# Altium footprint library connectors.PcbLib: 256 footprints (part 11 of 16)
Each footprint in its own frame and in the unit in brackets; x right, y up, seen from the top. Pads: shape width x height; smd on the part's side, far side on the other; paste and mask are expansions set on the pad; w line width, h text height; cw(c..) or ccw(c..) is an arc to the next point about the centre after c.
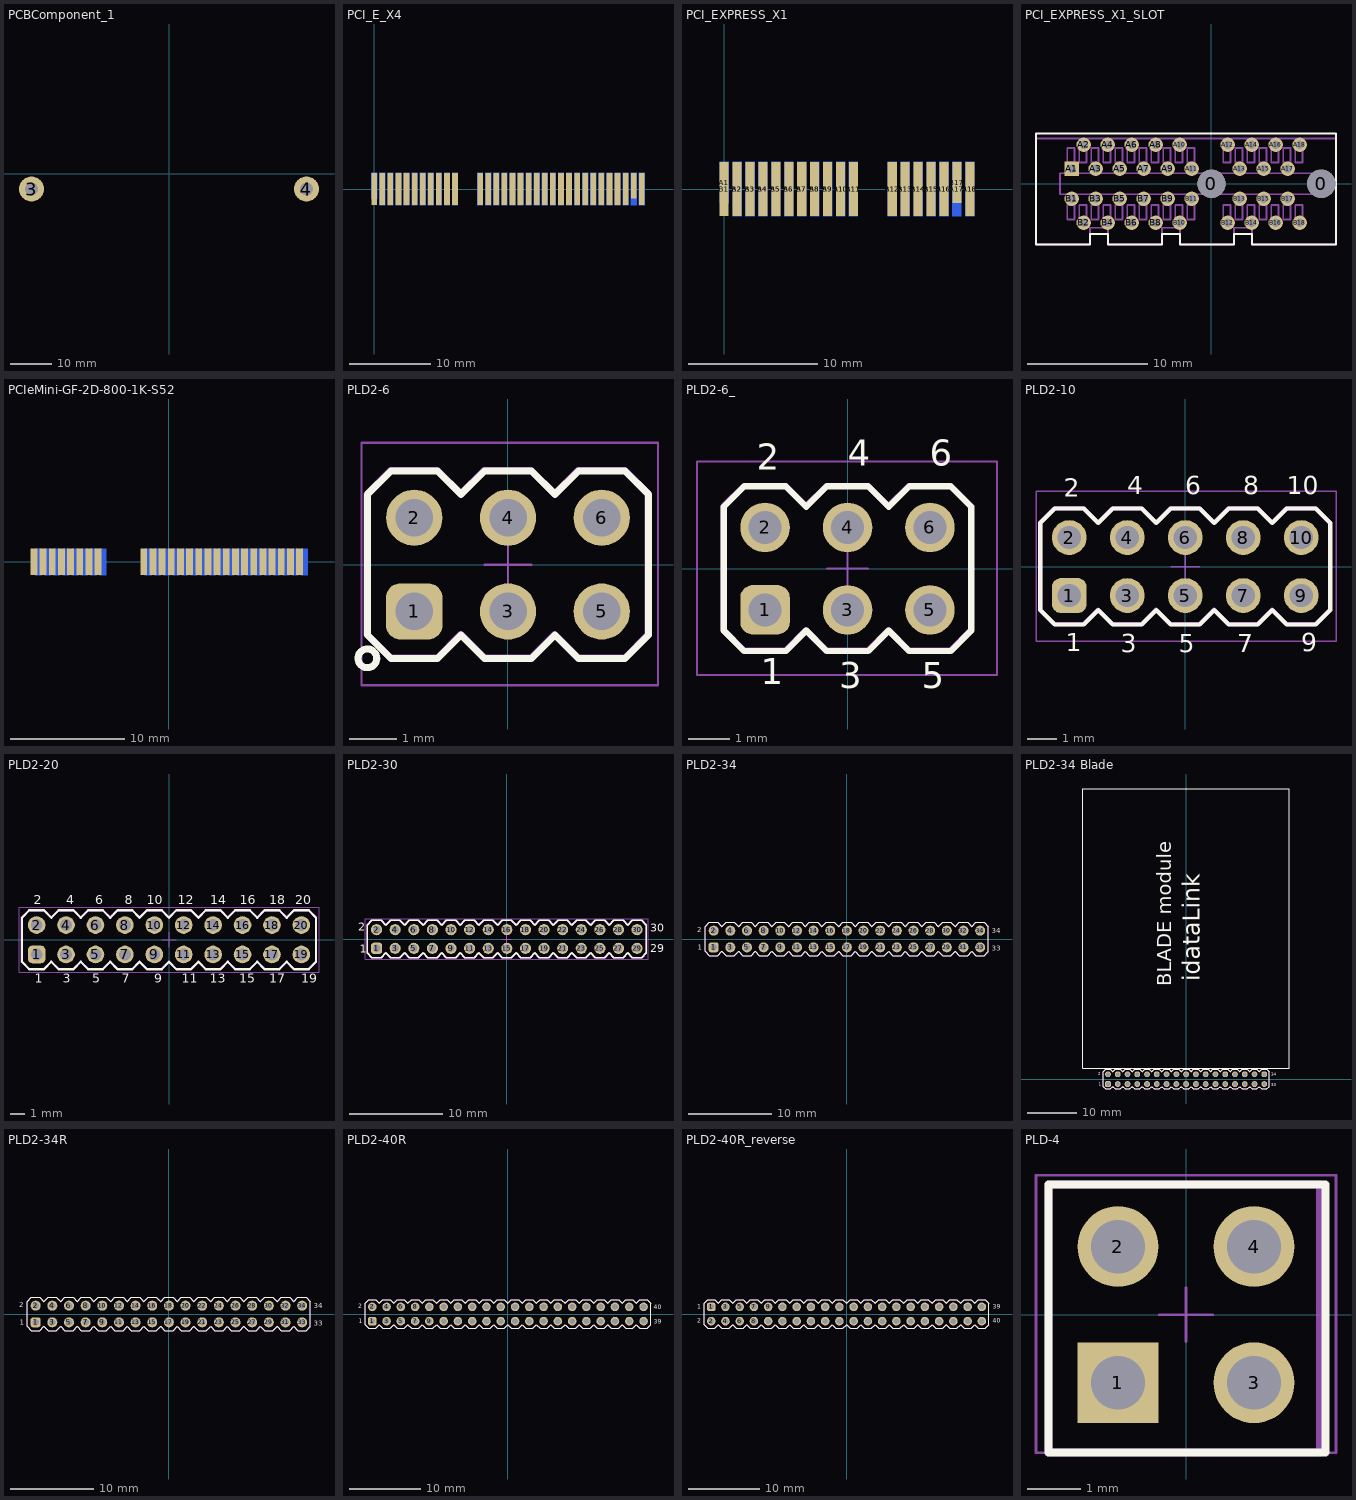
[diagram p10: the footprints below, top view; thin cyan lines are the x and y axes]

## PCBComponent_1 [mm]
pads (2):
  round 6 hole 3.2: 3(-33,-3.6) 4(33,-3.6)
3D body "Konica_Minolta_1024i.stp": height -0.5, standoff -95.2, extent -64.1,-8.6 67.1,8.6

## PCI_E_X4 [mm]
pads (64):
  rect 0.7x3.2 smd far side: A1(0,0.4)
  rect 0.7x4 smd far side: A2(1,0) A3(2,0) A4(3,0) A5(4,0) A6(5,0) A7(6,0) A8(7,0) A9(8,0) A10(9,0) A11(10,0) A12(13.1,0) A13(14.1,0) A14(15.1,0) A15(16.1,0) A16(17.1,0) A17(18.1,0) A18(19.1,0) A19(20.1,0) A20(21.1,0) A21(22.1,0) A22(23.1,0) A23(24.1,0) A24(25.1,0) A25(26.1,0) A26(27.1,0) A27(28.1,0) A28(29.1,0) A29(30.1,0) A30(31.1,0) A31(32.1,0) A32(33.1,0)
  rect 0.7x4 smd: B1(0,0) B2(1,0) B3(2,0) B4(3,0) B5(4,0) B6(5,0) B7(6,0) B8(7,0) B9(8,0) B10(9,0) B11(10,0) B12(13.1,0) B13(14.1,0) B14(15.1,0) B15(16.1,0) B16(17.1,0) B17(18.1,0) B18(19.1,0) B19(20.1,0) B20(21.1,0) B21(22.1,0) B22(23.1,0) B23(24.1,0) B24(25.1,0) B25(26.1,0) B26(27.1,0) B27(28.1,0) B28(29.1,0) B29(30.1,0) B30(31.1,0) B32(33.1,0)
  rect 0.7x3.2 smd: B31(32.1,0.4)

## PCI_EXPRESS_X1 [mm]
pads (36):
  rect 0.7x3.2 smd far side: A1(0,0.5)
  rect 0.7x4.2 smd far side: A2(1,0) A3(2,0) A4(3,0) A5(4,0) A6(5,0) A7(6,0) A8(7,0) A9(8,0) A10(9,0) A11(10,0) A12(13,0) A13(14,0) A14(15,0) A15(16,0) A16(17,0) A17(18,0) A18(19,0)
  rect 0.7x4.2 smd: B1(0,0) B2(1,0) B3(2,0) B4(3,0) B5(4,0) B6(5,0) B7(6,0) B8(7,0) B9(8,0) B10(9,0) B11(10,0) B12(13,0) B13(14,0) B14(15,0) B15(16,0) B16(17,0) B18(19,0)
  rect 0.7x3.2 smd: B17(18,0.5)

## PCI_EXPRESS_X1_SLOT [mm] "PCI Express Connector 36 Circuits 87715-9006 MOLEX"
height 11.2
pads (38):
  round 2.35 hole 2.35 unplated mask+0.075: 0(0,0)
  round 2.35 hole 2.35 unplated: 0(9.15,0)
  rect 1.2x1.2 hole 0.7: A1(-11.65,1.25)
  round 1.2 hole 0.7: A2(-10.65,3.25) A3(-9.65,1.25) A4(-8.65,3.25) A5(-7.65,1.25) A6(-6.65,3.25) A7(-5.65,1.25) A8(-4.65,3.25) A9(-3.65,1.25) A10(-2.65,3.25) A11(-1.65,1.25) A12(1.35,3.25) A13(2.35,1.25) A14(3.35,3.25) A15(4.35,1.25) A16(5.35,3.25) A17(6.35,1.25) A18(7.35,3.25) B1(-11.65,-1.25) B2(-10.65,-3.25) B3(-9.65,-1.25) B4(-8.65,-3.25) B5(-7.65,-1.25) B6(-6.65,-3.25) B7(-5.65,-1.25) B8(-4.65,-3.25) B9(-3.65,-1.25) B10(-2.65,-3.25) B11(-1.65,-1.25) B12(1.35,-3.25) B13(2.35,-1.25) B14(3.35,-3.25) B15(4.35,-1.25) B16(5.35,-3.25) B17(6.35,-1.25) B18(7.35,-3.25)
Top Overlay:
  lines w0.15: -14.625,-5.075 -14.625,4.2 10.375,4.2 10.375,-5.075 3.375,-5.075 3.375,-4.2 1.875,-4.2 1.875,-5.075 -2.625,-5.075 -2.625,-4.2 -4.125,-4.2 -4.125,-5.075 -8.625,-5.075 -8.625,-4.2 -10.125,-4.2 -10.125,-5.075 -14.625,-5.075
TopAssy 13:
  drawing of 167 lines, arcs and shapes, not listed
3D body "877159006.stp": height 11.16, standoff -4.44, extent -14.625,-5.075 10.375,3.775

## PCIeMini-GF-2D-800-1K-S52 [mm] "Golden finger, PCIeMini, Dual, Staggered, Pitch 0.8mm, 52-Position"
pads (52):
  rect 0.6x2.3 smd paste-0.9: 1(-11.8,0) 3(-11,0) 5(-10.2,0) 7(-9.4,0) 9(-8.6,0) 11(-7.8,0) 13(-7,0) 15(-6.2,0) 17(-2.2,0) 19(-1.4,0) 21(-0.6,0) 23(0.2,0) 25(1,0) 27(1.8,0) 29(2.6,0) 31(3.4,0) 33(4.2,0) 35(5,0) 37(5.8,0) 39(6.6,0) 41(7.4,0) 43(8.2,0) 45(9,0) 47(9.8,0) 49(10.6,0) 51(11.4,0)
  rect 0.6x2.3 smd far side paste-0.9: 2(-11.4,0) 4(-10.6,0) 6(-9.8,0) 8(-9,0) 10(-8.2,0) 12(-7.4,0) 14(-6.6,0) 16(-5.8,0) 18(-1.8,0) 20(-1,0) 22(-0.2,0) 24(0.6,0) 26(1.4,0) 28(2.2,0) 30(3,0) 32(3.8,0) 34(4.6,0) 36(5.4,0) 38(6.2,0) 40(7,0) 42(7.8,0) 44(8.6,0) 46(9.4,0) 48(10.2,0) 50(11,0) 52(11.8,0)
Top Solder:
  rectangle: -13.1,-1.65 13.1,1.275
Bottom Solder:
  rectangle: -13.1,-1.65 13.1,1.275

## PLD2-6 [mm]
pads (6):
  rrect50% 1.2x1.2 hole 0.8: 1(-2,-1)
  round 1.2 hole 0.8: 2(-2,1) 3(0,-1) 4(0,1) 5(2,-1) 6(2,1)
Top Overlay:
  circle w0.15: c-3,-2 r0.2
  lines w0.15: -3,1.5 -3,1.5 ; -3,1.5 -2.5,2 -1.5,2 -1,1.5 -0.5,2 0.5,2 1,1.5 ; -3,1.5 -3,-1.5 -2.5,-2 -1.5,-2 -1,-1.5 ; -1,-1.5 -0.5,-2 0.5,-2 1,-1.5 ; -1,-1.5 -1,-1.5 ; 1,-1.5 1.5,-2 2.5,-2 3,-1.5 3,1.5 2.5,2 1.5,2 1,1.5 ; 1,-1.5 1,-1.5 ; 1,1.5 1,1.5
TopAssy 13:
  lines w0.15: -3.008,1.508 -3.008,-1.492 -2.508,-1.992 -1.508,-1.992 -1.008,-1.492 -1.008,-1.492 -0.508,-1.992 0.492,-1.992 0.992,-1.492 ; -3.008,1.508 -2.508,2.008 -1.508,2.008 -1.008,1.508 -0.508,2.008 0.492,2.008 0.992,1.508 ; -3.008,1.508 -3.008,1.508 ; 0.992,-1.492 0.992,-1.492 ; 0.992,-1.492 1.492,-1.992 2.492,-1.992 2.992,-1.492 ; 0.992,1.508 1.492,2.008 2.492,2.008 2.992,1.508 2.992,-1.492 ; 0.992,1.508 0.992,1.508 ; 2.992,-1.492 2.992,-1.492 ; -2.4,-1.4 -2.4,-0.6 -1.625,-0.6 -1.625,-1.4 -2.4,-1.4
TopCourt 15:
  lines w0.05: -0.5,0 0.5,0 ; 0,-0.5 0,0.5 ; -3.125,-2.575 3.2,-2.575 3.2,2.6 -3.125,2.6 -3.125,-2.575
3D body: height 6, standoff -2, extent 1.691,0.701 2.289,1.299
3D body: height 6, standoff -2, extent 1.691,-1.299 2.289,-0.701
3D body: height 6, standoff -2, extent -0.309,0.701 0.289,1.299
3D body: height 6, standoff -2, extent -2.309,0.701 -1.711,1.299
3D body: height 6, standoff -2, extent -0.309,-1.299 0.289,-0.701
3D body: height 6, standoff -2, extent -2.309,-1.299 -1.711,-0.701
3D body: height 2, standoff 0, extent -3.047,-2.054 2.953,1.947

## PLD2-6_ [mm]
height 2.1
pads (6):
  rrect50% 1.2x1.2 hole 0.8: 1(-2,-1)
  round 1.2 hole 0.8: 2(-2,1) 3(0,-1) 4(0,1) 5(2,-1) 6(2,1)
Top Overlay:
  lines w0.15: -3,1.5 -3,1.5 ; -3,1.5 -2.5,2 -1.5,2 -1,1.5 -0.5,2 0.5,2 1,1.5 ; -3,1.5 -3,-1.5 -2.5,-2 -1.5,-2 -1,-1.5 ; -1,-1.5 -0.5,-2 0.5,-2 1,-1.5 ; -1,-1.5 -1,-1.5 ; 1,-1.5 1.5,-2 2.5,-2 3,-1.5 ; 1,-1.5 1,-1.5 ; 1,1.5 1,1.5 ; 1,1.5 1.5,2 2.5,2 3,1.5 3,-1.5 ; 3,-1.5 3,-1.5
  text "6" at 2,2.5 h0.63
  text "4" at 0,2.5 h0.63
  text "2" at -2.2,2.4 h0.63
  text "5" at 1.8,-2.9 h0.63
  text "3" at -0.2,-2.9 h0.63
  text "1" at -2.1,-2.8 h0.63
TopAssy 13:
  lines w0.15: -3.008,1.508 -3.008,-1.492 -2.508,-1.992 -1.508,-1.992 -1.008,-1.492 -1.008,-1.492 -0.508,-1.992 0.492,-1.992 0.992,-1.492 ; -3.008,1.508 -2.508,2.008 -1.508,2.008 -1.008,1.508 -0.508,2.008 0.492,2.008 0.992,1.508 ; -3.008,1.508 -3.008,1.508 ; 0.992,-1.492 0.992,-1.492 ; 0.992,-1.492 1.492,-1.992 2.492,-1.992 2.992,-1.492 ; 0.992,1.508 1.492,2.008 2.492,2.008 2.992,1.508 2.992,-1.492 ; 0.992,1.508 0.992,1.508 ; 2.992,-1.492 2.992,-1.492 ; -2.2,-1.2 -1.8,-1.2 -1.8,-0.8 -2.2,-0.8 -2.2,-1.2 ; -2.2,0.8 -2.2,1.2 -1.8,1.2 -1.8,0.8 -2.2,0.8 ; -0.2,-1.2 -0.2,-0.8 0.2,-0.8 0.2,-1.2 -0.2,-1.2 ; -0.2,0.8 -0.2,1.2 0.2,1.2 0.2,0.8 -0.2,0.8 ; 1.8,-1.2 1.8,-0.8 2.2,-0.8 2.2,-1.2 1.8,-1.2 ; 1.8,0.8 1.8,1.2 2.2,1.2 2.2,0.8 1.8,0.8
TopCourt 15:
  lines w0.05: -0.5,0 0.5,0 ; 0,-0.5 0,0.5 ; -3.65,-2.575 -3.65,2.6 3.625,2.6 3.625,-2.575 -3.65,-2.575
3D body: height 6, standoff -2, extent 1.691,0.701 2.289,1.299
3D body: height 6, standoff -2, extent 1.691,-1.299 2.289,-0.701
3D body: height 6, standoff -2, extent -0.309,0.701 0.289,1.299
3D body: height 6, standoff -2, extent -2.309,0.701 -1.711,1.299
3D body: height 6, standoff -2, extent -0.309,-1.299 0.289,-0.701
3D body: height 6, standoff -2, extent -2.309,-1.299 -1.711,-0.701
3D body: height 2, standoff 0, extent -3.048,-2.054 3,1.947

## PLD2-10 [mm]
height 2.1
pads (10):
  rrect50% 1.2x1.2 hole 0.8: 1(-4,-1)
  round 1.2 hole 0.8: 2(-4,1) 3(-2,-1) 4(-2,1) 5(0,-1) 6(0,1) 7(2,-1) 8(2,1) 9(4,-1) 10(4,1)
Top Overlay:
  lines w0.15: -5,1.5 -5,-1.5 -4.5,-2 -3.5,-2 -3,-1.5 ; -5,1.5 -4.5,2 -3.5,2 -3,1.5 -2.5,2 -1.5,2 -1,1.5 ; -5,1.5 -5,1.5 ; -3,-1.5 -3,-1.5 ; -3,-1.5 -2.5,-2 -1.5,-2 -1,-1.5 ; -1,-1.5 -1,-1.5 ; -1,-1.5 -0.5,-2 0.5,-2 1,-1.5 ; -1,1.5 -0.5,2 0.5,2 1,1.5 1.5,2 2.5,2 3,1.5 3.5,2 4.5,2 5,1.5 5,-1.5 4.5,-2 3.5,-2 3,-1.5 2.5,-2 1.5,-2 1,-1.5 ; -1,1.5 -1,1.5 ; 1,-1.5 1,-1.5
  text "10" at 3.5,2.5 h0.63
  text "9" at 4,-2.925 h0.63
  text "8" at 2,2.5 h0.63
  text "7" at 1.8,-2.95 h0.63
  text "1" at -4.125,-2.925 h0.63
  text "3" at -2.225,-2.95 h0.63
  text "5" at -0.225,-2.95 h0.63
  text "2" at -4.2,2.4 h0.63
  text "4" at -2,2.5 h0.63
  text "6" at 0,2.5 h0.63
TopAssy 13:
  lines w0.15: -5.008,1.508 -5.008,1.508 ; -5.008,1.508 -4.508,2.008 -3.508,2.008 -3.008,1.508 -2.508,2.008 -1.508,2.008 -1.008,1.508 -1.008,1.508 -0.508,2.008 0.492,2.008 0.992,1.508 1.492,2.008 2.492,2.008 2.992,1.508 3.492,2.008 4.492,2.008 4.992,1.508 4.992,-1.492 4.492,-1.992 3.492,-1.992 2.992,-1.492 2.492,-1.992 1.492,-1.992 0.992,-1.492 ; -5.008,1.508 -5.008,-1.492 -4.508,-1.992 -3.508,-1.992 -3.008,-1.492 ; -3.008,-1.492 -2.508,-1.992 -1.508,-1.992 -1.008,-1.492 ; -3.008,-1.492 -3.008,-1.492 ; -1.008,-1.492 -0.508,-1.992 0.492,-1.992 0.992,-1.492 ; -1.008,-1.492 -1.008,-1.492 ; 0.992,-1.492 0.992,-1.492 ; -4.3,-1.425 -4.3,-0.625 -3.525,-0.625 -3.525,-1.425 -4.3,-1.425
TopCourt 15:
  lines w0.05: -0.5,0 0.5,0 ; 0,-0.5 0,0.5 ; -5.15,-2.575 -5.15,2.6 5.2,2.6 5.2,-2.575 -5.15,-2.575
3D body: height 2, standoff 0, extent -5.048,-2.054 4.954,1.947
3D body: height 6, standoff -2, extent -4.309,-1.299 -3.711,-0.701
3D body: height 6, standoff -2, extent -2.309,-1.299 -1.711,-0.701
3D body: height 6, standoff -2, extent -4.309,0.701 -3.711,1.299
3D body: height 6, standoff -2, extent -2.309,0.701 -1.711,1.299
3D body: height 6, standoff -2, extent -0.309,-1.299 0.289,-0.701
3D body: height 6, standoff -2, extent 1.691,-1.299 2.289,-0.701
3D body: height 6, standoff -2, extent 3.691,-1.299 4.289,-0.701
3D body: height 6, standoff -2, extent -0.309,0.701 0.289,1.299
3D body: height 6, standoff -2, extent 1.691,0.701 2.289,1.299
3D body: height 6, standoff -2, extent 3.691,0.701 4.289,1.299

## PLD2-20 [mm]
height 2.1
pads (20):
  rrect50% 1.2x1.2 hole 0.8: 1(-9,-1)
  round 1.2 hole 0.8: 2(-9,1) 3(-7,-1) 4(-7,1) 5(-5,-1) 6(-5,1) 7(-3,-1) 8(-3,1) 9(-1,-1) 10(-1,1) 11(1,-1) 12(1,1) 13(3,-1) 14(3,1) 15(5,-1) 16(5,1) 17(7,-1) 18(7,1) 19(9,-1) 20(9,1)
Top Overlay:
  lines w0.15: -10,1.5 -10,1.5 ; -10,1.5 -9.5,2 -8.5,2 -8,1.5 -7.5,2 -6.5,2 -6,1.5 ; -10,1.5 -10,-1.5 -9.5,-2 -8.5,-2 -8,-1.5 ; -8,-1.5 -7.5,-2 -6.5,-2 -6,-1.5 ; -8,-1.5 -8,-1.5 ; -6,-1.5 -5.5,-2 -4.5,-2 -4,-1.5 ; -6,-1.5 -6,-1.5 ; -6,1.5 -6,1.5 ; -6,1.5 -5.5,2 -4.5,2 -4,1.5 -3.5,2 -2.5,2 -2,1.5 -1.5,2 -0.5,2 0,1.5 ; -4,-1.5 -3.5,-2 -2.5,-2 -2,-1.5 -1.5,-2 -0.5,-2 0,-1.5 0.5,-2 1.5,-2 2,-1.5 ; -4,-1.5 -4,-1.5 ; 0,1.5 0.5,2 1.5,2 2,1.5 2.5,2 3.5,2 4,1.5 ; 0,1.5 0,1.5 ; 2,-1.5 2,-1.5 ; 2,-1.5 2.5,-2 3.5,-2 4,-1.5 ; 4,-1.5 4,-1.5 ; 4,-1.5 4.5,-2 5.5,-2 6,-1.5 ; 4,1.5 4.5,2 5.5,2 6,1.5 6.5,2 7.5,2 8,1.5 8.5,2 9.5,2 10,1.5 10,-1.5 9.5,-2 8.5,-2 8,-1.5 7.5,-2 6.5,-2 6,-1.5 ; 4,1.5 4,1.5 ; 6,-1.5 6,-1.5
  text "6" at -5,2.4 h0.63
  text "4" at -7,2.4 h0.63
  text "2" at -9.2,2.4 h0.63
  text "5" at -5.225,-2.925 h0.63
  text "3" at -7.225,-2.925 h0.63
  text "1" at -9.125,-2.925 h0.63
  text "7" at -3.2,-2.925 h0.63
  text "8" at -3,2.4 h0.63
  text "9" at -1,-2.925 h0.63
  text "10" at -1.5,2.4 h0.63
  text "20" at 8.6,2.4 h0.63
  text "18" at 6.8,2.4 h0.63
  text "12" at 0.6,2.4 h0.63
  text "14" at 2.8,2.4 h0.63
  text "16" at 4.8,2.4 h0.63
  text "19" at 9,-2.925 h0.63
  text "17" at 6.8,-2.925 h0.63
  text "11" at 0.875,-2.925 h0.63
  text "13" at 2.775,-2.925 h0.63
  text "15" at 4.775,-2.925 h0.63
TopAssy 13:
  lines w0.15: -10.008,1.508 -10.008,-1.492 -9.508,-1.992 -8.508,-1.992 -8.008,-1.492 ; -10.008,1.508 -9.508,2.008 -8.508,2.008 -8.008,1.508 -7.508,2.008 -6.508,2.008 -6.008,1.508 ; -10.008,1.508 -10.008,1.508 ; -8.008,-1.492 -8.008,-1.492 ; -8.008,-1.492 -7.508,-1.992 -6.508,-1.992 -6.008,-1.492 ; -6.008,-1.492 -6.008,-1.492 ; -6.008,-1.492 -5.508,-1.992 -4.508,-1.992 -4.008,-1.492 ; -6.008,1.508 -5.508,2.008 -4.508,2.008 -4.008,1.508 -3.508,2.008 -2.508,2.008 -2.008,1.508 -1.508,2.008 -0.508,2.008 -0.008,1.508 ; -6.008,1.508 -6.008,1.508 ; -4.008,-1.492 -4.008,-1.492 ; -4.008,-1.492 -3.508,-1.992 -2.508,-1.992 -2.008,-1.492 -1.508,-1.992 -0.508,-1.992 -0.008,-1.492 0.492,-1.992 1.492,-1.992 1.992,-1.492 ; -0.008,1.508 -0.008,1.508 ; -0.008,1.508 0.492,2.008 1.492,2.008 1.992,1.508 2.492,2.008 3.492,2.008 3.992,1.508 ; 1.992,-1.492 2.492,-1.992 3.492,-1.992 3.992,-1.492 ; 1.992,-1.492 1.992,-1.492 ; 3.992,-1.492 4.492,-1.992 5.492,-1.992 5.992,-1.492 ; 3.992,-1.492 3.992,-1.492 ; 3.992,1.508 3.992,1.508 ; 3.992,1.508 4.492,2.008 5.492,2.008 5.992,1.508 6.492,2.008 7.492,2.008 7.992,1.508 8.492,2.008 9.492,2.008 9.992,1.508 9.992,-1.492 9.492,-1.992 8.492,-1.992 7.992,-1.492 7.492,-1.992 6.492,-1.992 5.992,-1.492 ; 5.992,-1.492 5.992,-1.492 ; -9.3,-1.425 -8.525,-1.425 -8.525,-0.625 -9.3,-0.625 -9.3,-1.425
TopCourt 15:
  lines w0.05: -0.5,0 0.5,0 ; 0,-0.5 0,0.5 ; -10.2,-2.2 10.2,-2.2 10.2,2.2 -10.2,2.2 -10.2,-2.2
3D body: height 6, standoff -2, extent -1.309,0.701 -0.711,1.299
3D body: height 6, standoff -2, extent -3.309,0.701 -2.711,1.299
3D body: height 6, standoff -2, extent -5.309,0.701 -4.711,1.299
3D body: height 6, standoff -2, extent -1.309,-1.299 -0.711,-0.701
3D body: height 6, standoff -2, extent -3.309,-1.299 -2.711,-0.701
3D body: height 6, standoff -2, extent -5.309,-1.299 -4.711,-0.701
3D body: height 6, standoff -2, extent -7.309,0.701 -6.711,1.299
3D body: height 6, standoff -2, extent -9.309,0.701 -8.711,1.299
3D body: height 6, standoff -2, extent -7.309,-1.299 -6.711,-0.701
3D body: height 6, standoff -2, extent -9.309,-1.299 -8.711,-0.701
3D body: height 2, standoff 0, extent -10.048,-2.054 -0.046,1.947
3D body: height 2, standoff 0, extent -0.048,-2.054 9.954,1.947
3D body: height 6, standoff -2, extent 0.691,-1.299 1.289,-0.701
3D body: height 6, standoff -2, extent 2.691,-1.299 3.289,-0.701
3D body: height 6, standoff -2, extent 0.691,0.701 1.289,1.299
3D body: height 6, standoff -2, extent 2.691,0.701 3.289,1.299
3D body: height 6, standoff -2, extent 4.691,-1.299 5.289,-0.701
3D body: height 6, standoff -2, extent 6.691,-1.299 7.289,-0.701
3D body: height 6, standoff -2, extent 8.691,-1.299 9.289,-0.701
3D body: height 6, standoff -2, extent 4.691,0.701 5.289,1.299
3D body: height 6, standoff -2, extent 6.691,0.701 7.289,1.299
3D body: height 6, standoff -2, extent 8.691,0.701 9.289,1.299

## PLD2-30 [mm]
height 2.1
pads (30):
  rrect50% 1.2x1.2 hole 0.8: 1(-14,-1)
  round 1.2 hole 0.8: 2(-14,1) 3(-12,-1) 4(-12,1) 5(-10,-1) 6(-10,1) 7(-8,-1) 8(-8,1) 9(-6,-1) 10(-6,1) 11(-4,-1) 12(-4,1) 13(-2,-1) 14(-2,1) 15(0,-1) 16(0,1) 17(2,-1) 18(2,1) 19(4,-1) 20(4,1) 21(6,-1) 22(6,1) 23(8,-1) 24(8,1) 25(10,-1) 26(10,1) 27(12,-1) 28(12,1) 29(14,-1) 30(14,1)
Top Overlay:
  lines w0.15: -15,1.5 -15,1.5 ; -15,1.5 -14.5,2 -13.5,2 -13,1.5 -12.5,2 -11.5,2 -11,1.5 ; -15,1.5 -15,-1.5 -14.5,-2 -13.5,-2 -13,-1.5 ; -13,-1.5 -12.5,-2 -11.5,-2 -11,-1.5 ; -13,-1.5 -13,-1.5 ; -11,-1.5 -10.5,-2 -9.5,-2 -9,-1.5 ; -11,-1.5 -11,-1.5 ; -11,1.5 -11,1.5 ; -11,1.5 -10.5,2 -9.5,2 -9,1.5 -8.5,2 -7.5,2 -7,1.5 -6.5,2 -5.5,2 -5,1.5 ; -9,-1.5 -8.5,-2 -7.5,-2 -7,-1.5 -6.5,-2 -5.5,-2 -5,-1.5 -4.5,-2 -3.5,-2 -3,-1.5 ; -9,-1.5 -9,-1.5 ; -5,1.5 -4.5,2 -3.5,2 -3,1.5 -2.5,2 -1.5,2 -1,1.5 ; -5,1.5 -5,1.5 ; -3,-1.5 -3,-1.5 ; -3,-1.5 -2.5,-2 -1.5,-2 -1,-1.5 ; -1,-1.5 -1,-1.5 ; -1,-1.5 -0.5,-2 0.5,-2 1,-1.5 ; -1,1.5 -0.5,2 0.5,2 1,1.5 1.5,2 2.5,2 3,1.5 3.5,2 4.5,2 5,1.5 ; -1,1.5 -1,1.5 ; 1,-1.5 1,-1.5 ; 1,-1.5 1.5,-2 2.5,-2 3,-1.5 3.5,-2 4.5,-2 5,-1.5 5.5,-2 6.5,-2 7,-1.5 ; 5,1.5 5,1.5 ; 5,1.5 5.5,2 6.5,2 7,1.5 7.5,2 8.5,2 9,1.5 ; 7,-1.5 7.5,-2 8.5,-2 9,-1.5 ; 7,-1.5 7,-1.5 ; 9,-1.5 9.5,-2 10.5,-2 11,-1.5 ; 9,-1.5 9,-1.5 ; 9,1.5 9,1.5 ; 9,1.5 9.5,2 10.5,2 11,1.5 11.5,2 12.5,2 13,1.5 13.5,2 14.5,2 15,1.5 15,-1.5 14.5,-2 13.5,-2 13,-1.5 12.5,-2 11.5,-2 11,-1.5 ; 11,-1.5 11,-1.5
  text "2" at -16,0.9 h0.85
  text "1" at -15.8,-1.5 h0.85
  text "29" at 15.4,-1.4 h0.85
  text "30" at 15.4,0.8 h0.85
TopAssy 13:
  lines w0.15: -15.008,1.508 -15.008,-1.492 -14.508,-1.992 -13.508,-1.992 -13.008,-1.492 ; -15.008,1.508 -14.508,2.008 -13.508,2.008 -13.008,1.508 -12.508,2.008 -11.508,2.008 -11.008,1.508 ; -15.008,1.508 -15.008,1.508 ; -13.008,-1.492 -13.008,-1.492 ; -13.008,-1.492 -12.508,-1.992 -11.508,-1.992 -11.008,-1.492 ; -11.008,-1.492 -11.008,-1.492 ; -11.008,-1.492 -10.508,-1.992 -9.508,-1.992 -9.008,-1.492 ; -11.008,1.508 -10.508,2.008 -9.508,2.008 -9.008,1.508 -8.508,2.008 -7.508,2.008 -7.008,1.508 -6.508,2.008 -5.508,2.008 -5.008,1.508 ; -11.008,1.508 -11.008,1.508 ; -9.008,-1.492 -9.008,-1.492 ; -9.008,-1.492 -8.508,-1.992 -7.508,-1.992 -7.008,-1.492 -6.508,-1.992 -5.508,-1.992 -5.008,-1.492 -4.508,-1.992 -3.508,-1.992 -3.008,-1.492 ; -5.008,1.508 -5.008,1.508 ; -5.008,1.508 -4.508,2.008 -3.508,2.008 -3.008,1.508 -2.508,2.008 -1.508,2.008 -1.008,1.508 ; -3.008,-1.492 -2.508,-1.992 -1.508,-1.992 -1.008,-1.492 ; -3.008,-1.492 -3.008,-1.492 ; -1.008,-1.492 -0.508,-1.992 0.492,-1.992 0.992,-1.492 ; -1.008,-1.492 -1.008,-1.492 ; -1.008,1.508 -1.008,1.508 ; -1.008,1.508 -0.508,2.008 0.492,2.008 0.992,1.508 1.492,2.008 2.492,2.008 2.992,1.508 3.492,2.008 4.492,2.008 4.992,1.508 ; 0.992,-1.492 1.492,-1.992 2.492,-1.992 2.992,-1.492 3.492,-1.992 4.492,-1.992 4.992,-1.492 5.492,-1.992 6.492,-1.992 6.992,-1.492 ; 0.992,-1.492 0.992,-1.492 ; 4.992,1.508 5.492,2.008 6.492,2.008 6.992,1.508 7.492,2.008 8.492,2.008 8.992,1.508 ; 4.992,1.508 4.992,1.508 ; 6.992,-1.492 6.992,-1.492 ; 6.992,-1.492 7.492,-1.992 8.492,-1.992 8.992,-1.492 ; 8.992,-1.492 8.992,-1.492 ; 8.992,-1.492 9.492,-1.992 10.492,-1.992 10.992,-1.492 ; 8.992,1.508 9.492,2.008 10.492,2.008 10.992,1.508 11.492,2.008 12.492,2.008 12.992,1.508 13.492,2.008 14.492,2.008 14.992,1.508 14.992,-1.492 14.492,-1.992 13.492,-1.992 12.992,-1.492 12.492,-1.992 11.492,-1.992 10.992,-1.492 ; 8.992,1.508 8.992,1.508 ; 10.992,-1.492 10.992,-1.492 ; -14.3,-1.425 -13.525,-1.425 -13.525,-0.625 -14.3,-0.625 -14.3,-1.425
TopCourt 15:
  lines w0.05: -0.5,0 0.5,0 ; 0,-0.5 0,0.5 ; -15.2,-2.2 15.2,-2.2 15.2,2.2 -15.2,2.2 -15.2,-2.2
3D body: height 6, standoff -2, extent -6.309,0.701 -5.711,1.299
3D body: height 6, standoff -2, extent -8.309,0.701 -7.711,1.299
3D body: height 6, standoff -2, extent -10.309,0.701 -9.711,1.299
3D body: height 6, standoff -2, extent -6.309,-1.299 -5.711,-0.701
3D body: height 6, standoff -2, extent -8.309,-1.299 -7.711,-0.701
3D body: height 6, standoff -2, extent -10.309,-1.299 -9.711,-0.701
3D body: height 6, standoff -2, extent -12.309,0.701 -11.711,1.299
3D body: height 6, standoff -2, extent -14.309,0.701 -13.711,1.299
3D body: height 6, standoff -2, extent -12.309,-1.299 -11.711,-0.701
3D body: height 6, standoff -2, extent -14.309,-1.299 -13.711,-0.701
3D body: height 2, standoff 0, extent -15.048,-2.054 -5.046,1.947
3D body: height 2, standoff 0, extent -5.048,-2.054 4.954,1.947
3D body: height 6, standoff -2, extent -4.309,-1.299 -3.711,-0.701
3D body: height 6, standoff -2, extent -2.309,-1.299 -1.711,-0.701
3D body: height 6, standoff -2, extent -4.309,0.701 -3.711,1.299
3D body: height 6, standoff -2, extent -2.309,0.701 -1.711,1.299
3D body: height 6, standoff -2, extent -0.309,-1.299 0.289,-0.701
3D body: height 6, standoff -2, extent 1.691,-1.299 2.289,-0.701
3D body: height 6, standoff -2, extent 3.691,-1.299 4.289,-0.701
3D body: height 6, standoff -2, extent -0.309,0.701 0.289,1.299
3D body: height 6, standoff -2, extent 1.691,0.701 2.289,1.299
3D body: height 6, standoff -2, extent 3.691,0.701 4.289,1.299
3D body: height 6, standoff -2, extent 13.691,0.701 14.289,1.299
3D body: height 6, standoff -2, extent 11.691,0.701 12.289,1.299
3D body: height 6, standoff -2, extent 9.691,0.701 10.289,1.299
3D body: height 6, standoff -2, extent 13.691,-1.299 14.289,-0.701
3D body: height 6, standoff -2, extent 11.691,-1.299 12.289,-0.701
3D body: height 6, standoff -2, extent 9.691,-1.299 10.289,-0.701
3D body: height 6, standoff -2, extent 7.691,0.701 8.289,1.299
3D body: height 6, standoff -2, extent 5.691,0.701 6.289,1.299
3D body: height 6, standoff -2, extent 7.691,-1.299 8.289,-0.701
3D body: height 6, standoff -2, extent 5.691,-1.299 6.289,-0.701
3D body: height 2, standoff 0, extent 4.952,-2.054 14.954,1.947

## PLD2-34 [mm]
height 2.1
pads (34):
  rrect50% 1.2x1.2 hole 0.8: 1(-16,-1)
  round 1.2 hole 0.8: 2(-16,1) 3(-14,-1) 4(-14,1) 5(-12,-1) 6(-12,1) 7(-10,-1) 8(-10,1) 9(-8,-1) 10(-8,1) 11(-6,-1) 12(-6,1) 13(-4,-1) 14(-4,1) 15(-2,-1) 16(-2,1) 17(0,-1) 18(0,1) 19(2,-1) 20(2,1) 21(4,-1) 22(4,1) 23(6,-1) 24(6,1) 25(8,-1) 26(8,1) 27(10,-1) 28(10,1) 29(12,-1) 30(12,1) 31(14,-1) 32(14,1) 33(16,-1) 34(16,1)
Top Overlay:
  lines w0.15: -17,1.5 -17,-1.5 -16.5,-2 -15.5,-2 -15,-1.5 ; -17,1.5 -16.5,2 -15.5,2 -15,1.5 -14.5,2 -13.5,2 -13,1.5 ; -17,1.5 -17,1.5 ; -15,-1.5 -15,-1.5 ; -15,-1.5 -14.5,-2 -13.5,-2 -13,-1.5 ; -13,-1.5 -13,-1.5 ; -13,-1.5 -12.5,-2 -11.5,-2 -11,-1.5 ; -13,1.5 -12.5,2 -11.5,2 -11,1.5 -10.5,2 -9.5,2 -9,1.5 -8.5,2 -7.5,2 -7,1.5 ; -13,1.5 -13,1.5 ; -11,-1.5 -11,-1.5 ; -11,-1.5 -10.5,-2 -9.5,-2 -9,-1.5 -8.5,-2 -7.5,-2 -7,-1.5 -6.5,-2 -5.5,-2 -5,-1.5 -4.5,-2 -3.5,-2 -3,-1.5 -2.5,-2 -1.5,-2 -1,-1.5 ; -7,1.5 -7,1.5 ; -7,1.5 -6.5,2 -5.5,2 -5,1.5 -4.5,2 -3.5,2 -3,1.5 ; -3,1.5 -3,1.5 ; -3,1.5 -2.5,2 -1.5,2 -1,1.5 -0.5,2 0.5,2 1,1.5 1.5,2 2.5,2 3,1.5 ; -1,-1.5 -0.5,-2 0.5,-2 1,-1.5 1.5,-2 2.5,-2 3,-1.5 ; -1,-1.5 -1,-1.5 ; 3,-1.5 3,-1.5 ; 3,-1.5 3.5,-2 4.5,-2 5,-1.5 5.5,-2 6.5,-2 7,-1.5 7.5,-2 8.5,-2 9,-1.5 ; 3,1.5 3,1.5 ; 3,1.5 3.5,2 4.5,2 5,1.5 5.5,2 6.5,2 7,1.5 ; 7,1.5 7,1.5 ; 7,1.5 7.5,2 8.5,2 9,1.5 9.5,2 10.5,2 11,1.5 11.5,2 12.5,2 13,1.5 13.5,2 14.5,2 15,1.5 15.5,2 16.5,2 17,1.5 17,-1.5 ; 9,-1.5 9.5,-2 10.5,-2 11,-1.5 11.5,-2 12.5,-2 13,-1.5 ; 9,-1.5 9,-1.5 ; 13,-1.5 13,-1.5 ; 13,-1.5 13,-1.5 ; 13,-1.5 13.5,-2 14.5,-2 15,-1.5 15.5,-2 16.5,-2 17,-1.5 ; 17,-1.5 17,-1.5
  text "1" at -17.9,-1.3 h0.63
  text "2" at -18,0.8 h0.63
  text "34" at 17.4,0.7 h0.63
  text "33" at 17.4,-1.4 h0.63
TopAssy 13:
  drawing of 390 lines, arcs and shapes, not listed
3D body "User Library-PLD2-34R.step": height 4.1, standoff -2.7, extent -17,-1.3 17,7.95

## PLD2-34 Blade [mm] "Blade iDatalink module"
height 2.1
pads (34):
  rrect50% 1.2x1.2 hole 0.8: 1(-16,-1)
  round 1.2 hole 0.8: 2(-16,1) 3(-14,-1) 4(-14,1) 5(-12,-1) 6(-12,1) 7(-10,-1) 8(-10,1) 9(-8,-1) 10(-8,1) 11(-6,-1) 12(-6,1) 13(-4,-1) 14(-4,1) 15(-2,-1) 16(-2,1) 17(0,-1) 18(0,1) 19(2,-1) 20(2,1) 21(4,-1) 22(4,1) 23(6,-1) 24(6,1) 25(8,-1) 26(8,1) 27(10,-1) 28(10,1) 29(12,-1) 30(12,1) 31(14,-1) 32(14,1) 33(16,-1) 34(16,1)
Top Overlay:
  lines w0.15: -17,1.5 -17,-1.5 -16.5,-2 -15.5,-2 -15,-1.5 ; -17,1.5 -16.5,2 -15.5,2 -15,1.5 -14.5,2 -13.5,2 -13,1.5 ; -17,1.5 -17,1.5 ; -15,-1.5 -15,-1.5 ; -15,-1.5 -14.5,-2 -13.5,-2 -13,-1.5 ; -13,-1.5 -13,-1.5 ; -13,-1.5 -12.5,-2 -11.5,-2 -11,-1.5 ; -13,1.5 -12.5,2 -11.5,2 -11,1.5 -10.5,2 -9.5,2 -9,1.5 -8.5,2 -7.5,2 -7,1.5 ; -13,1.5 -13,1.5 ; -11,-1.5 -11,-1.5 ; -11,-1.5 -10.5,-2 -9.5,-2 -9,-1.5 -8.5,-2 -7.5,-2 -7,-1.5 -6.5,-2 -5.5,-2 -5,-1.5 -4.5,-2 -3.5,-2 -3,-1.5 -2.5,-2 -1.5,-2 -1,-1.5 ; -7,1.5 -7,1.5 ; -7,1.5 -6.5,2 -5.5,2 -5,1.5 -4.5,2 -3.5,2 -3,1.5 ; -3,1.5 -3,1.5 ; -3,1.5 -2.5,2 -1.5,2 -1,1.5 -0.5,2 0.5,2 1,1.5 1.5,2 2.5,2 3,1.5 ; -1,-1.5 -0.5,-2 0.5,-2 1,-1.5 1.5,-2 2.5,-2 3,-1.5 ; -1,-1.5 -1,-1.5 ; 3,-1.5 3,-1.5 ; 3,-1.5 3.5,-2 4.5,-2 5,-1.5 5.5,-2 6.5,-2 7,-1.5 7.5,-2 8.5,-2 9,-1.5 ; 3,1.5 3,1.5 ; 3,1.5 3.5,2 4.5,2 5,1.5 5.5,2 6.5,2 7,1.5 ; 7,1.5 7,1.5 ; 7,1.5 7.5,2 8.5,2 9,1.5 9.5,2 10.5,2 11,1.5 11.5,2 12.5,2 13,1.5 13.5,2 14.5,2 15,1.5 15.5,2 16.5,2 17,1.5 17,-1.5 ; 9,-1.5 9.5,-2 10.5,-2 11,-1.5 11.5,-2 12.5,-2 13,-1.5 ; 9,-1.5 9,-1.5 ; 13,-1.5 13,-1.5 ; 13,-1.5 13,-1.5 ; 13,-1.5 13.5,-2 14.5,-2 15,-1.5 15.5,-2 16.5,-2 17,-1.5 ; 17,-1.5 17,-1.5 ; -21.2,2.2 21.15,2.2 21.15,59.4 -21.2,59.4 -21.2,2.2
  text "idataLink" at 4,20 h6
  text "BLADE module" at -2,19 h5
  text "1" at -17.9,-1.3 h0.63
  text "2" at -18,0.8 h0.63
  text "34" at 17.4,0.7 h0.63
  text "33" at 17.4,-1.4 h0.63
TopAssy 13:
  drawing of 390 lines, arcs and shapes, not listed
3D body "Blade A.STEP": height -0.4, standoff -7.7, extent -21.025,4.225 20.975,59.225
3D body "User Library-PLD2-34R.step": height 4.1, standoff -2.7, extent -17,-1.3 17,7.95

## PLD2-34R [mm]
height 2.1
pads (34):
  rrect50% 1.2x1.2 hole 0.8: 1(-16,-1)
  round 1.2 hole 0.8: 2(-16,1) 3(-14,-1) 4(-14,1) 5(-12,-1) 6(-12,1) 7(-10,-1) 8(-10,1) 9(-8,-1) 10(-8,1) 11(-6,-1) 12(-6,1) 13(-4,-1) 14(-4,1) 15(-2,-1) 16(-2,1) 17(0,-1) 18(0,1) 19(2,-1) 20(2,1) 21(4,-1) 22(4,1) 23(6,-1) 24(6,1) 25(8,-1) 26(8,1) 27(10,-1) 28(10,1) 29(12,-1) 30(12,1) 31(14,-1) 32(14,1) 33(16,-1) 34(16,1)
Top Overlay:
  lines w0.15: -17,1.5 -17,-1.5 -16.5,-2 -15.5,-2 -15,-1.5 ; -17,1.5 -16.5,2 -15.5,2 -15,1.5 -14.5,2 -13.5,2 -13,1.5 ; -17,1.5 -17,1.5 ; -15,-1.5 -15,-1.5 ; -15,-1.5 -14.5,-2 -13.5,-2 -13,-1.5 ; -13,-1.5 -13,-1.5 ; -13,-1.5 -12.5,-2 -11.5,-2 -11,-1.5 ; -13,1.5 -12.5,2 -11.5,2 -11,1.5 -10.5,2 -9.5,2 -9,1.5 -8.5,2 -7.5,2 -7,1.5 ; -13,1.5 -13,1.5 ; -11,-1.5 -11,-1.5 ; -11,-1.5 -10.5,-2 -9.5,-2 -9,-1.5 -8.5,-2 -7.5,-2 -7,-1.5 -6.5,-2 -5.5,-2 -5,-1.5 -4.5,-2 -3.5,-2 -3,-1.5 -2.5,-2 -1.5,-2 -1,-1.5 ; -7,1.5 -7,1.5 ; -7,1.5 -6.5,2 -5.5,2 -5,1.5 -4.5,2 -3.5,2 -3,1.5 ; -3,1.5 -3,1.5 ; -3,1.5 -2.5,2 -1.5,2 -1,1.5 -0.5,2 0.5,2 1,1.5 1.5,2 2.5,2 3,1.5 ; -1,-1.5 -0.5,-2 0.5,-2 1,-1.5 1.5,-2 2.5,-2 3,-1.5 ; -1,-1.5 -1,-1.5 ; 3,-1.5 3,-1.5 ; 3,-1.5 3.5,-2 4.5,-2 5,-1.5 5.5,-2 6.5,-2 7,-1.5 7.5,-2 8.5,-2 9,-1.5 ; 3,1.5 3,1.5 ; 3,1.5 3.5,2 4.5,2 5,1.5 5.5,2 6.5,2 7,1.5 ; 7,1.5 7,1.5 ; 7,1.5 7.5,2 8.5,2 9,1.5 9.5,2 10.5,2 11,1.5 11.5,2 12.5,2 13,1.5 13.5,2 14.5,2 15,1.5 15.5,2 16.5,2 17,1.5 17,-1.5 ; 9,-1.5 9.5,-2 10.5,-2 11,-1.5 11.5,-2 12.5,-2 13,-1.5 ; 9,-1.5 9,-1.5 ; 13,-1.5 13,-1.5 ; 13,-1.5 13,-1.5 ; 13,-1.5 13.5,-2 14.5,-2 15,-1.5 15.5,-2 16.5,-2 17,-1.5 ; 17,-1.5 17,-1.5
  text "1" at -17.9,-1.3 h0.63
  text "2" at -18,0.8 h0.63
  text "34" at 17.4,0.7 h0.63
  text "33" at 17.4,-1.4 h0.63
TopAssy 13:
  drawing of 390 lines, arcs and shapes, not listed
3D body "User Library-PLD2-34R.step": height 4.1, standoff -2.7, extent -17,-1.3 17,7.95

## PLD2-40R [mm]
height 2.1
pads (40):
  rrect50% 1.2x1.2 hole 0.8: 1(-19,-1)
  round 1.2 hole 0.8: 2(-19,1) 3(-17,-1) 4(-17,1) 5(-15,-1) 6(-15,1) 7(-13,-1) 8(-13,1) 9(-11,-1) 10(-11,1) 11(-9,-1) 12(-9,1) 13(-7,-1) 14(-7,1) 15(-5,-1) 16(-5,1) 17(-3,-1) 18(-3,1) 19(-1,-1) 20(-1,1) 21(1,-1) 22(1,1) 23(3,-1) 24(3,1) 25(5,-1) 26(5,1) 27(7,-1) 28(7,1) 29(9,-1) 30(9,1) 31(11,-1) 32(11,1) 33(13,-1) 34(13,1) 35(15,-1) 36(15,1) 37(17,-1) 38(17,1) 39(19,-1) 40(19,1)
Top Overlay:
  lines w0.15: -20,1.5 -20,1.5 ; -20,1.5 -19.5,2 -18.5,2 -18,1.5 -17.5,2 -16.5,2 -16,1.5 ; -20,1.5 -20,-1.5 -19.5,-2 -18.5,-2 -18,-1.5 ; -18,-1.5 -17.5,-2 -16.5,-2 -16,-1.5 ; -18,-1.5 -18,-1.5 ; -16,-1.5 -15.5,-2 -14.5,-2 -14,-1.5 ; -16,-1.5 -16,-1.5 ; -16,1.5 -16,1.5 ; -16,1.5 -15.5,2 -14.5,2 -14,1.5 -13.5,2 -12.5,2 -12,1.5 -11.5,2 -10.5,2 -10,1.5 ; -14,-1.5 -13.5,-2 -12.5,-2 -12,-1.5 -11.5,-2 -10.5,-2 -10,-1.5 -9.5,-2 -8.5,-2 -8,-1.5 -7.5,-2 -6.5,-2 -6,-1.5 -5.5,-2 -4.5,-2 -4,-1.5 ; -14,-1.5 -14,-1.5 ; -10,1.5 -9.5,2 -8.5,2 -8,1.5 -7.5,2 -6.5,2 -6,1.5 ; -10,1.5 -10,1.5 ; -6,1.5 -5.5,2 -4.5,2 -4,1.5 -3.5,2 -2.5,2 -2,1.5 -1.5,2 -0.5,2 0,1.5 ; -6,1.5 -6,1.5 ; -4,-1.5 -4,-1.5 ; -4,-1.5 -3.5,-2 -2.5,-2 -2,-1.5 -1.5,-2 -0.5,-2 0,-1.5 ; 0,-1.5 0.5,-2 1.5,-2 2,-1.5 2.5,-2 3.5,-2 4,-1.5 4.5,-2 5.5,-2 6,-1.5 ; 0,-1.5 0,-1.5 ; 0,1.5 0.5,2 1.5,2 2,1.5 2.5,2 3.5,2 4,1.5 ; 0,1.5 0,1.5 ; 4,1.5 4.5,2 5.5,2 6,1.5 6.5,2 7.5,2 8,1.5 8.5,2 9.5,2 10,1.5 10.5,2 11.5,2 12,1.5 12.5,2 13.5,2 14,1.5 14.5,2 15.5,2 16,1.5 16.5,2 17.5,2 18,1.5 18.5,2 19.5,2 20,1.5 20,-1.5 ; 4,1.5 4,1.5 ; 6,-1.5 6,-1.5 ; 6,-1.5 6.5,-2 7.5,-2 8,-1.5 8.5,-2 9.5,-2 10,-1.5 ; 10,-1.5 10.5,-2 11.5,-2 12,-1.5 12.5,-2 13.5,-2 14,-1.5 ; 10,-1.5 10,-1.5 ; 10,-1.5 10,-1.5 ; 14,-1.5 14,-1.5 ; 14,-1.5 14.5,-2 15.5,-2 16,-1.5 ; 16,-1.5 16.5,-2 17.5,-2 18,-1.5 18.5,-2 19.5,-2 20,-1.5 ; 16,-1.5 16,-1.5 ; 16,-1.5 16,-1.5 ; 20,-1.5 20,-1.5
  text "2" at -21,0.8 h0.63
  text "1" at -20.9,-1.3 h0.63
  text "39" at 20.4,-1.4 h0.63
  text "40" at 20.4,0.7 h0.63
TopAssy 13:
  drawing of 459 lines, arcs and shapes, not listed
3D body "User Library-PLD2-40-R.step": height 5.3, standoff -3.95, extent -20,-2 20,4.8

## PLD2-40R_reverse [mm]
height 2.1
pads (40):
  rrect50% 1.2x1.2 hole 0.8: 1(-19,1)
  round 1.2 hole 0.8: 2(-19,-1) 3(-17,1) 4(-17,-1) 5(-15,1) 6(-15,-1) 7(-13,1) 8(-13,-1) 9(-11,1) 10(-11,-1) 11(-9,1) 12(-9,-1) 13(-7,1) 14(-7,-1) 15(-5,1) 16(-5,-1) 17(-3,1) 18(-3,-1) 19(-1,1) 20(-1,-1) 21(1,1) 22(1,-1) 23(3,1) 24(3,-1) 25(5,1) 26(5,-1) 27(7,1) 28(7,-1) 29(9,1) 30(9,-1) 31(11,1) 32(11,-1) 33(13,1) 34(13,-1) 35(15,1) 36(15,-1) 37(17,1) 38(17,-1) 39(19,1) 40(19,-1)
Top Overlay:
  lines w0.15: -20,1.5 -20,1.5 ; -20,1.5 -19.5,2 -18.5,2 -18,1.5 -17.5,2 -16.5,2 -16,1.5 ; -20,1.5 -20,-1.5 -19.5,-2 -18.5,-2 -18,-1.5 ; -18,-1.5 -17.5,-2 -16.5,-2 -16,-1.5 ; -18,-1.5 -18,-1.5 ; -16,-1.5 -15.5,-2 -14.5,-2 -14,-1.5 ; -16,-1.5 -16,-1.5 ; -16,1.5 -16,1.5 ; -16,1.5 -15.5,2 -14.5,2 -14,1.5 -13.5,2 -12.5,2 -12,1.5 -11.5,2 -10.5,2 -10,1.5 ; -14,-1.5 -13.5,-2 -12.5,-2 -12,-1.5 -11.5,-2 -10.5,-2 -10,-1.5 -9.5,-2 -8.5,-2 -8,-1.5 -7.5,-2 -6.5,-2 -6,-1.5 -5.5,-2 -4.5,-2 -4,-1.5 ; -14,-1.5 -14,-1.5 ; -10,1.5 -9.5,2 -8.5,2 -8,1.5 -7.5,2 -6.5,2 -6,1.5 ; -10,1.5 -10,1.5 ; -6,1.5 -5.5,2 -4.5,2 -4,1.5 -3.5,2 -2.5,2 -2,1.5 -1.5,2 -0.5,2 0,1.5 ; -6,1.5 -6,1.5 ; -4,-1.5 -4,-1.5 ; -4,-1.5 -3.5,-2 -2.5,-2 -2,-1.5 -1.5,-2 -0.5,-2 0,-1.5 ; 0,-1.5 0.5,-2 1.5,-2 2,-1.5 2.5,-2 3.5,-2 4,-1.5 4.5,-2 5.5,-2 6,-1.5 ; 0,-1.5 0,-1.5 ; 0,1.5 0.5,2 1.5,2 2,1.5 2.5,2 3.5,2 4,1.5 ; 0,1.5 0,1.5 ; 4,1.5 4.5,2 5.5,2 6,1.5 6.5,2 7.5,2 8,1.5 8.5,2 9.5,2 10,1.5 10.5,2 11.5,2 12,1.5 12.5,2 13.5,2 14,1.5 14.5,2 15.5,2 16,1.5 16.5,2 17.5,2 18,1.5 18.5,2 19.5,2 20,1.5 20,-1.5 ; 4,1.5 4,1.5 ; 6,-1.5 6,-1.5 ; 6,-1.5 6.5,-2 7.5,-2 8,-1.5 8.5,-2 9.5,-2 10,-1.5 ; 10,-1.5 10.5,-2 11.5,-2 12,-1.5 12.5,-2 13.5,-2 14,-1.5 ; 10,-1.5 10,-1.5 ; 10,-1.5 10,-1.5 ; 14,-1.5 14,-1.5 ; 14,-1.5 14.5,-2 15.5,-2 16,-1.5 ; 16,-1.5 16.5,-2 17.5,-2 18,-1.5 18.5,-2 19.5,-2 20,-1.5 ; 16,-1.5 16,-1.5 ; 16,-1.5 16,-1.5 ; 20,-1.5 20,-1.5
  text "2" at -21,-1.25 h0.63
  text "1" at -21,0.75 h0.63
  text "39" at 20.5,0.75 h0.63
  text "40" at 20.5,-1.25 h0.63
TopAssy 13:
  drawing of 459 lines, arcs and shapes, not listed
3D body "User Library-PLD2-40-R.step": height 5.3, standoff -3.95, extent -20,-4.8 20,2

## PLD-4 [mm] "Разъем"
height 5
pads (4):
  rect 1.51x1.51 hole 1: 1(-1.27,-1.27)
  round 1.51 hole 1: 2(-1.27,1.27) 3(1.27,-1.27) 4(1.27,1.27)
Top Overlay:
  lines w0.15: -2.57,-2.57 2.6,-2.57 2.6,2.43 -2.57,2.43 -2.57,-2.57
TopAssy 13:
  lines w0.15: -2.57,-2.57 -2.57,2.43 2.5,2.43 2.5,-2.57 -2.57,-2.57 ; -1.675,-1.675 -0.9,-1.675 -0.9,-0.875 -1.675,-0.875 -1.675,-1.675
TopCourt 15:
  lines w0.05: -0.5,0 0.5,0 ; 0,-0.5 0,0.5 ; -2.8,-2.575 2.8,-2.575 2.8,2.6 -2.8,2.6 -2.8,-2.575
3D body "PLD4.STEP": height 10.1, standoff -1.5, extent -2.54,-2.54 2.54,2.54